# Altium footprint library HSD_connectors.PcbLib: 59 footprints (part 3 of 7)
Each footprint in its own frame and in the unit in brackets; x right, y up, seen from the top. Pads: shape width x height; smd on the part's side, far side on the other; paste and mask are expansions set on the pad; w line width, h text height; cw(c..) or ccw(c..) is an arc to the next point about the centre after c.
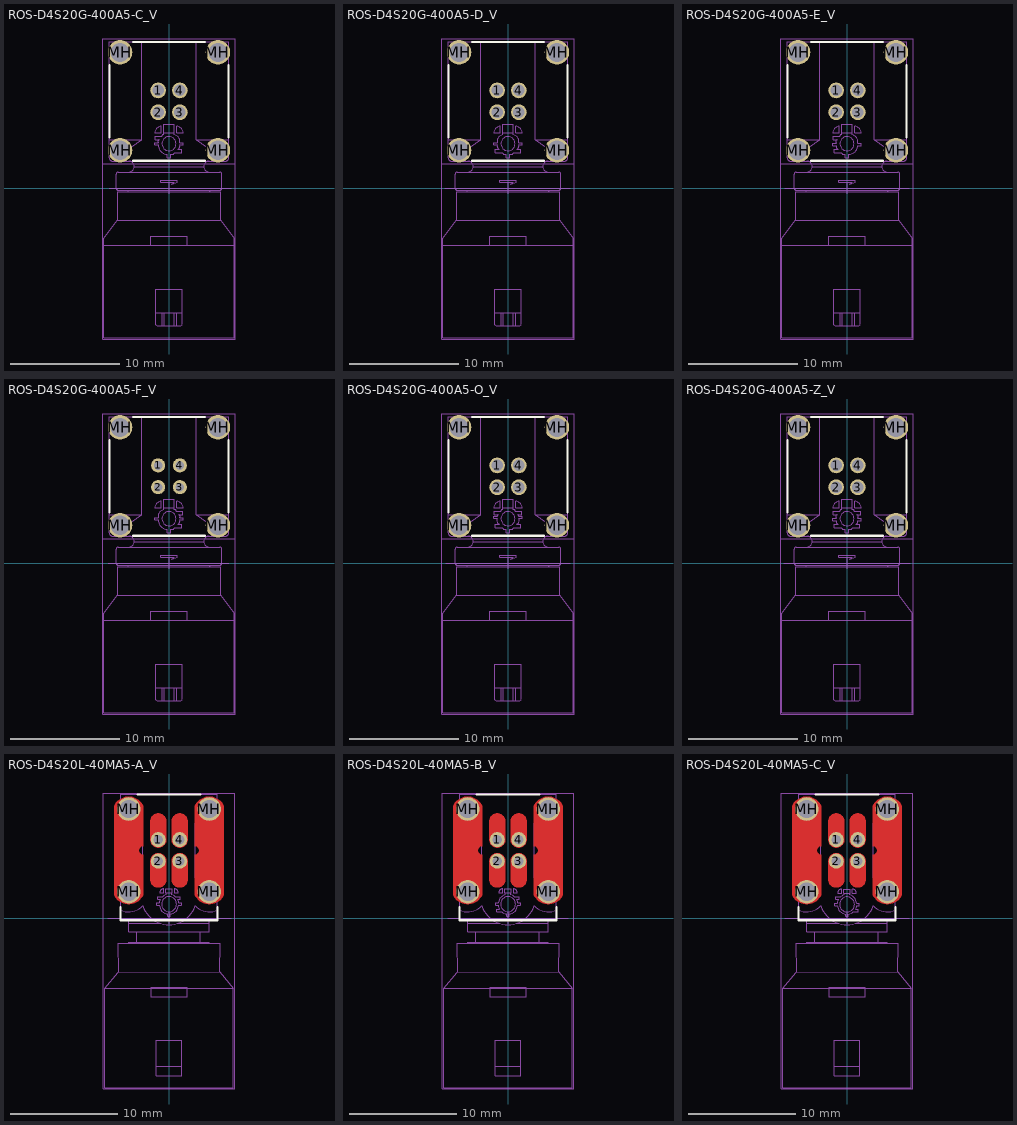
[diagram p2: the footprints below, top view; thin cyan lines are the x and y axes]

## ROS-D4S20G-400A5-C_V [mm] "HSD Right Angle Plug, 27.2x12x10.6mm, Rosenberger Recommended"
height 10.6
pads (8):
  round 1.45 hole 1.05: 1(-1,9) 2(-1,7) 3(1,7) 4(1,9)
  round 2.25 hole 1.75: MH(-4.5,3.5) MH(-4.5,12.5) MH(4.5,3.5) MH(4.5,12.5)
Top Overlay:
  lines w0.2: -5.461,4.684 -5.461,11.316 ; -3.316,2.539 3.316,2.539 ; -3.316,13.461 3.316,13.461 ; 5.461,4.684 5.461,11.316
Mechanical 3:
  lines w0.1: -5.5,0 5.7,0
  text "Board Edge" at -5.7,-0.7 h0.2
Mechanical 13:
  circle w0.1: c-0.002,4.102 r0.65
  lines w0.1: -5.958,-5.25 -1.7,-5.25 ; -4.025,2.5 -4.025,3.411 ; -3.853,-0.2 -3.734,-0.3 ; -3.7,2.5 cw(c-3.7,2) -3.7,1.5 ; -3.19,2.006 3.185,2.006 ; -2.507,4.444 -5.5,4.45 ; -2.498,13.45 -2.498,4.45 -4.025,3.411 ; -1.2,-11.45 1.185,-11.45 cw(c1.185,-11.472) 1.2,-11.456 ; -0.65,-11.45 -0.648,-12.647 ; -0.424,-12.653 -0.422,-11.456 ; 0.417,-11.456 0.419,-12.653 ; 0.5,5.084 0.5,4.919 cw(c0.387,4.315) 0.991,4.202 1.321,4.202 1.321,3.999 0.991,3.999 cw(c0.699,3.884) 0.813,3.592 1.168,3.592 1.168,3.288 0.533,3.288 cw(c0.267,3.402) 0.152,3.135 0.152,2.83 -0.152,2.83 -0.152,3.135 cw(c-0.14,3.986) -0.991,3.999 -1.321,3.999 -1.321,4.202 -0.991,4.202 cw(c-0.813,4.304) -0.914,4.481 -1.245,4.481 -1.245,4.786 -0.686,4.786 cw(c-0.528,4.758) -0.5,4.916 -0.5,5.1 ; 0.645,-11.45 0.648,-12.647 ; 1.2,-12.527 1.079,-12.647 -1.084,-12.647 -1.2,-12.531 -1.2,-9.3 1.2,-9.3 1.2,-12.5 ; 2.498,13.45 2.498,4.45 ; 3.7,2.5 ccw(c3.7,2) 3.7,1.5 ; 3.716,-0.3 3.809,-0.207 ; 4.025,2.5 4.025,3.411 ; 5.958,-5.25 1.7,-5.25 ; -5.5,3.411 -5.5,2.8 ccw(c-5.2,2.8) -5.2,2.5 5.2,2.5 ccw(c5.2,2.8) 5.5,2.8 5.5,3.411 ; -5.5,3.411 -4.025,3.411 ; -5.5,3.411 -5.5,4.45 ; -5.5,4.45 -5.5,13.45 5.5,13.45 5.5,4.45 ; -4.742,-2.95 4.742,-2.95 ; -4.742,-2.95 -4.75,-0.3 4.75,-0.3 4.742,-2.95 ; -4.742,-2.95 -6,-4.607 -6,-5.45 -6,-13.75 6,-13.75 6,-5.45 6,-4.607 4.742,-2.95 ; -3.7,1.5 3.7,1.5 ; -3.7,1.5 -4.65,1.5 ccw(c-4.65,1.3) -4.85,1.3 -4.85,0.017 ccw(c-4.65,0.017) -4.65,-0.183 -3.7,-0.183 3.7,-0.183 4.65,-0.183 ccw(c4.65,0.017) 4.85,0.017 4.85,1.3 ccw(c4.65,1.3) 4.65,1.5 3.7,1.5 ; -1.7,-5.25 1.7,-5.25 ; -1.7,-5.25 -1.7,-4.4 1.7,-4.4 1.7,-5.25 ; -0.5,5.1 0.5,5.1 0.5,5.9 -0.5,5.9 -0.5,5.1 ; 2.498,4.45 4.025,3.411 ; 2.498,4.45 5.5,4.45 ; 4.025,3.411 5.5,3.411 ; 5.5,3.411 5.5,4.45 ; -1.3,5.1 cw(c-0.7,5.1) -0.7,5.7 -0.7,5.1 -1.3,5.1 ; -0.75,0.562 -0.75,0.75 0.75,0.75 0.75,0.562 0.271,0.375 0.495,0.562 -0.75,0.562 ; 0.7,5.1 1.3,5.1 ccw(c0.7,5.1) 0.7,5.7 0.7,5.1
  text ".Designator" at -2.147,10.711 h2.69
Mechanical 15:
  lines w0.05: -6.1,2.275 6.096,2.275 ; -6.1,-13.85 6.1,-13.85 6.1,13.725 -6.1,13.725 -6.1,-13.85
  lines w0.1: -0.5,0 0.5,0 ; 0,-0.5 0,0.5
3D body "d4s20g-400A5-C.stp": height 13.63, standoff -2.87, extent -6,-13.75 6,13.45

## ROS-D4S20G-400A5-D_V [mm] "HSD Right Angle Plug, 27.2x12x10.6mm, Rosenberger Recommended"
height 10.6
pads (8):
  round 1.45 hole 1.05: 1(-1,9) 2(-1,7) 3(1,7) 4(1,9)
  round 2.25 hole 1.75: MH(-4.5,3.5) MH(-4.5,12.5) MH(4.5,3.5) MH(4.5,12.5)
Top Overlay:
  lines w0.2: -5.461,4.684 -5.461,11.316 ; -3.316,2.539 3.316,2.539 ; -3.316,13.461 3.316,13.461 ; 5.461,4.684 5.461,11.316
Mechanical 3:
  lines w0.1: -5.8,0 5.7,0
  text "Board Edge" at -5.7,-0.5 h0.2
Mechanical 13:
  circle w0.1: c-0.002,4.102 r0.65
  lines w0.1: -5.958,-5.25 -1.7,-5.25 ; -4.025,2.5 -4.025,3.411 ; -3.853,-0.2 -3.734,-0.3 ; -3.7,2.5 cw(c-3.7,2) -3.7,1.5 ; -3.19,2.006 3.185,2.006 ; -2.507,4.444 -5.5,4.45 ; -2.498,13.45 -2.498,4.45 -4.025,3.411 ; -1.2,-11.45 1.185,-11.45 cw(c1.185,-11.472) 1.2,-11.456 ; -0.65,-11.45 -0.648,-12.647 ; -0.424,-12.653 -0.422,-11.456 ; 0.417,-11.456 0.419,-12.653 ; 0.5,5.084 0.5,4.919 cw(c0.387,4.315) 0.991,4.202 1.321,4.202 1.321,3.999 0.991,3.999 cw(c0.699,3.884) 0.813,3.592 1.168,3.592 1.168,3.288 0.533,3.288 cw(c0.267,3.402) 0.152,3.135 0.152,2.83 -0.152,2.83 -0.152,3.135 cw(c-0.267,3.402) -0.533,3.288 -1.168,3.288 -1.168,3.592 -0.813,3.592 cw(c-0.699,3.884) -0.991,3.999 -1.321,3.999 -1.321,4.202 -0.991,4.202 cw(c-0.388,4.314) -0.5,4.916 -0.5,5.1 ; 0.645,-11.45 0.648,-12.647 ; 1.2,-12.527 1.079,-12.647 -1.084,-12.647 -1.2,-12.531 -1.2,-9.3 1.2,-9.3 1.2,-12.5 ; 2.498,13.45 2.498,4.45 ; 3.7,2.5 ccw(c3.7,2) 3.7,1.5 ; 3.716,-0.3 3.809,-0.207 ; 4.025,2.5 4.025,3.411 ; 5.958,-5.25 1.7,-5.25 ; -5.5,3.411 -5.5,2.8 ccw(c-5.2,2.8) -5.2,2.5 5.2,2.5 ccw(c5.2,2.8) 5.5,2.8 5.5,3.411 ; -5.5,3.411 -4.025,3.411 ; -5.5,3.411 -5.5,4.45 ; -5.5,4.45 -5.5,13.45 5.5,13.45 5.5,4.45 ; -4.742,-2.95 4.742,-2.95 ; -4.742,-2.95 -4.75,-0.3 4.75,-0.3 4.742,-2.95 ; -4.742,-2.95 -6,-4.607 -6,-5.45 -6,-13.75 6,-13.75 6,-5.45 6,-4.607 4.742,-2.95 ; -3.7,1.5 3.7,1.5 ; -3.7,1.5 -4.65,1.5 ccw(c-4.65,1.3) -4.85,1.3 -4.85,0.017 ccw(c-4.65,0.017) -4.65,-0.183 -3.7,-0.183 3.7,-0.183 4.65,-0.183 ccw(c4.65,0.017) 4.85,0.017 4.85,1.3 ccw(c4.65,1.3) 4.65,1.5 3.7,1.5 ; -1.7,-5.25 1.7,-5.25 ; -1.7,-5.25 -1.7,-4.4 1.7,-4.4 1.7,-5.25 ; -0.5,5.1 0.5,5.1 0.5,5.9 -0.5,5.9 -0.5,5.1 ; 2.498,4.45 4.025,3.411 ; 2.498,4.45 5.5,4.45 ; 4.025,3.411 5.5,3.411 ; 5.5,3.411 5.5,4.45 ; -1.3,5.1 cw(c-0.7,5.1) -0.7,5.7 -0.7,5.1 -1.3,5.1 ; -0.75,0.562 -0.75,0.75 0.75,0.75 0.75,0.562 0.271,0.375 0.495,0.562 -0.75,0.562 ; 0.7,5.1 0.7,5.7 cw(c0.7,5.1) 1.3,5.1 0.7,5.1
  text ".Designator" at -2.147,10.838 h2.69
Mechanical 15:
  lines w0.05: -6.1,2.275 6.096,2.275 ; -6.1,-13.85 6.1,-13.85 6.1,13.725 -6.1,13.725 -6.1,-13.85
  lines w0.1: -0.5,0 0.5,0 ; 0,-0.5 0,0.5
3D body "d4s20g-400A5-D.stp": height 13.63, standoff -2.87, extent -6,-13.75 6,13.45

## ROS-D4S20G-400A5-E_V [mm] "HSD Right Angle Plug, 27.2x12x10.6mm, Rosenberger Recommended"
height 10.6
pads (8):
  round 1.45 hole 1.05: 1(-1,9) 2(-1,7) 3(1,7) 4(1,9)
  round 2.25 hole 1.75: MH(-4.5,3.5) MH(-4.5,12.5) MH(4.5,3.5) MH(4.5,12.5)
Top Overlay:
  lines w0.2: -5.461,4.684 -5.461,11.316 ; -3.316,2.539 3.316,2.539 ; -3.316,13.461 3.316,13.461 ; 5.461,4.684 5.461,11.316
Mechanical 3:
  lines w0.1: -5.7,0 5.7,0
  text "Board Edge" at -5.7,-0.5 h0.2
Mechanical 13:
  circle w0.1: c-0.002,4.102 r0.65
  lines w0.1: -5.958,-5.25 -1.7,-5.25 ; -4.025,2.5 -4.025,3.411 ; -3.853,-0.2 -3.734,-0.3 ; -3.7,2.5 cw(c-3.7,2) -3.7,1.5 ; -3.19,2.006 3.185,2.006 ; -2.507,4.444 -5.5,4.45 ; -2.498,13.45 -2.498,4.45 -4.025,3.411 ; -1.2,-11.45 1.185,-11.45 cw(c1.185,-11.472) 1.2,-11.456 ; -0.65,-11.45 -0.648,-12.647 ; -0.424,-12.653 -0.422,-11.456 ; 0.417,-11.456 0.419,-12.653 ; 0.5,5.084 0.5,4.919 cw(c0.355,4.283) 0.991,4.138 1.321,4.138 1.321,3.935 0.991,3.935 cw(c0.171,3.954) 0.152,3.135 0.152,2.83 -0.152,2.83 -0.152,3.135 cw(c-0.267,3.402) -0.533,3.288 -1.168,3.288 -1.168,3.592 -0.813,3.592 cw(c-0.73,3.853) -0.991,3.935 -1.321,3.935 -1.321,4.138 -0.991,4.138 cw(c-0.781,4.272) -0.914,4.481 -1.245,4.481 -1.245,4.786 -0.686,4.786 cw(c-0.528,4.758) -0.5,4.916 -0.5,5.1 ; 0.645,-11.45 0.648,-12.647 ; 1.2,-12.527 1.079,-12.647 -1.084,-12.647 -1.2,-12.531 -1.2,-9.3 1.2,-9.3 1.2,-12.5 ; 2.498,13.45 2.498,4.45 ; 3.7,2.5 ccw(c3.7,2) 3.7,1.5 ; 3.716,-0.3 3.809,-0.207 ; 4.025,2.5 4.025,3.411 ; 5.958,-5.25 1.7,-5.25 ; -5.5,3.411 -5.5,2.8 ccw(c-5.2,2.8) -5.2,2.5 5.2,2.5 ccw(c5.2,2.8) 5.5,2.8 5.5,3.411 ; -5.5,3.411 -4.025,3.411 ; -5.5,3.411 -5.5,4.45 ; -5.5,4.45 -5.5,13.45 5.5,13.45 5.5,4.45 ; -4.742,-2.95 4.742,-2.95 ; -4.742,-2.95 -4.75,-0.3 4.75,-0.3 4.742,-2.95 ; -4.742,-2.95 -6,-4.607 -6,-5.45 -6,-13.75 6,-13.75 6,-5.45 6,-4.607 4.742,-2.95 ; -3.7,1.5 3.7,1.5 ; -3.7,1.5 -4.65,1.5 ccw(c-4.65,1.3) -4.85,1.3 -4.85,0.017 ccw(c-4.65,0.017) -4.65,-0.183 -3.7,-0.183 3.7,-0.183 4.65,-0.183 ccw(c4.65,0.017) 4.85,0.017 4.85,1.3 ccw(c4.65,1.3) 4.65,1.5 3.7,1.5 ; -1.7,-5.25 1.7,-5.25 ; -1.7,-5.25 -1.7,-4.4 1.7,-4.4 1.7,-5.25 ; -0.5,5.1 0.5,5.1 0.5,5.9 -0.5,5.9 -0.5,5.1 ; 2.498,4.45 4.025,3.411 ; 2.498,4.45 5.5,4.45 ; 4.025,3.411 5.5,3.411 ; 5.5,3.411 5.5,4.45 ; -1.3,5.1 cw(c-0.7,5.1) -0.7,5.7 -0.7,5.1 -1.3,5.1 ; -0.75,0.562 -0.75,0.75 0.75,0.75 0.75,0.562 0.271,0.375 0.495,0.562 -0.75,0.562 ; 0.7,5.1 0.7,5.7 cw(c0.7,5.1) 1.3,5.1 0.7,5.1
  text ".Designator" at -2.274,10.457 h2.69
Mechanical 15:
  lines w0.05: -6.1,2.275 6.096,2.275 ; -6.1,-13.85 -6.1,13.725 6.1,13.725 6.1,-13.85 -6.1,-13.85
  lines w0.1: -0.5,0 0.5,0 ; 0,-0.5 0,0.5
3D body "d4s20g-400A5-E.stp": height 13.63, standoff -2.87, extent -6,-13.75 6,13.45

## ROS-D4S20G-400A5-F_V [mm] "HSD Right Angle Plug, 27.2x12x10.6mm, Rosenberger Recommended"
height 10.6
pads (8):
  round 1.3 hole 0.8: 1(-1,9) 2(-1,7) 3(1,7) 4(1,9)
  round 2.25 hole 1.75: MH(-4.5,3.5) MH(-4.5,12.5) MH(4.5,3.5) MH(4.5,12.5)
Top Overlay:
  lines w0.2: -5.461,4.684 -5.461,11.316 ; -3.316,2.539 3.316,2.539 ; -3.316,13.461 3.316,13.461 ; 5.461,4.684 5.461,11.316
Mechanical 3:
  lines w0.1: -5.6,0 5.5,0
  text "Board Edge" at -5.8,-0.5 h0.2
Mechanical 13:
  circle w0.1: c0.002,4.102 r0.65
  lines w0.1: -5.958,-5.25 -1.7,-5.25 ; -4.025,2.5 -4.025,3.411 ; -3.853,-0.2 -3.734,-0.3 ; -3.7,2.5 cw(c-3.7,2) -3.7,1.5 ; -3.19,2.006 3.185,2.006 ; -2.507,4.444 -5.5,4.45 ; -2.498,13.45 -2.498,4.45 -4.025,3.411 ; -1.2,-11.45 1.185,-11.45 cw(c1.185,-11.472) 1.2,-11.456 ; -0.65,-11.45 -0.648,-12.647 ; -0.424,-12.653 -0.422,-11.456 ; 0.417,-11.456 0.419,-12.653 ; 0.5,5.084 0.5,4.919 cw(c0.527,4.76) 0.686,4.786 1.245,4.786 1.245,4.481 0.914,4.481 cw(c0.813,4.304) 0.991,4.202 1.321,4.202 1.321,3.999 0.991,3.999 cw(c0.699,3.884) 0.813,3.592 1.168,3.592 1.168,3.288 0.533,3.288 cw(c0.267,3.402) 0.152,3.135 0.152,2.83 -0.152,2.83 -0.152,3.135 cw(c-0.14,3.986) -0.991,3.999 -1.321,3.999 -1.321,4.202 -0.991,4.202 cw(c-0.388,4.314) -0.5,4.916 -0.5,5.1 ; 0.645,-11.45 0.648,-12.647 ; 1.2,-12.527 1.079,-12.647 -1.084,-12.647 -1.2,-12.531 -1.2,-9.3 1.2,-9.3 1.2,-12.5 ; 2.498,13.45 2.498,4.45 ; 3.7,2.5 ccw(c3.7,2) 3.7,1.5 ; 3.716,-0.3 3.809,-0.207 ; 4.025,2.5 4.025,3.411 ; 5.958,-5.25 1.7,-5.25 ; -5.5,3.411 -5.5,4.45 ; -5.5,3.411 -4.025,3.411 ; -5.5,3.411 -5.5,2.8 ccw(c-5.2,2.8) -5.2,2.5 5.2,2.5 ccw(c5.2,2.8) 5.5,2.8 5.5,3.411 ; -5.5,4.45 -5.5,13.45 5.5,13.45 5.5,4.45 ; -4.742,-2.95 -6,-4.607 -6,-5.45 -6,-13.75 6,-13.75 6,-5.45 6,-4.607 4.742,-2.95 ; -4.742,-2.95 -4.75,-0.3 4.75,-0.3 4.742,-2.95 ; -4.742,-2.95 4.742,-2.95 ; -3.7,1.5 -4.65,1.5 ccw(c-4.65,1.3) -4.85,1.3 -4.85,0.017 ccw(c-4.65,0.017) -4.65,-0.183 -3.7,-0.183 3.7,-0.183 4.65,-0.183 ccw(c4.65,0.017) 4.85,0.017 4.85,1.3 ccw(c4.65,1.3) 4.65,1.5 3.7,1.5 ; -3.7,1.5 3.7,1.5 ; -1.7,-5.25 -1.7,-4.4 1.7,-4.4 1.7,-5.25 ; -1.7,-5.25 1.7,-5.25 ; -0.5,5.1 -0.5,5.9 0.5,5.9 0.5,5.1 -0.5,5.1 ; 2.498,4.45 5.5,4.45 ; 2.498,4.45 4.025,3.411 ; 4.025,3.411 5.5,3.411 ; 5.5,3.411 5.5,4.45 ; -1.3,5.1 cw(c-0.7,5.1) -0.7,5.7 -0.7,5.1 -1.3,5.1 ; -0.75,0.562 0.495,0.562 0.271,0.375 0.75,0.562 0.75,0.75 -0.75,0.75 -0.75,0.562 ; 0.7,5.1 1.3,5.1 ccw(c0.7,5.1) 0.7,5.7 0.7,5.1
  text ".Designator" at -2.401,10.457 h2.69
Mechanical 15:
  lines w0.05: -6.1,2.275 6.096,2.275 ; -6.1,-13.85 -6.1,13.725 6.1,13.725 6.1,-13.85 -6.1,-13.85
  lines w0.1: -0.5,0 0.5,0 ; 0,-0.5 0,0.5
3D body "d4s20g-400A5-F.stp": height 13.63, standoff -2.87, extent -6,-13.75 6,13.45

## ROS-D4S20G-400A5-O_V [mm] "HSD Right Angle Plug, 27.2x12x10.6mm, Rosenberger Recommended"
height 10.6
pads (8):
  round 1.45 hole 1.05: 1(-1,9) 2(-1,7) 3(1,7) 4(1,9)
  round 2.25 hole 1.75: MH(-4.5,3.5) MH(-4.5,12.5) MH(4.5,3.5) MH(4.5,12.5)
Top Overlay:
  lines w0.2: -5.461,4.684 -5.461,11.316 ; -3.316,2.539 3.316,2.539 ; -3.316,13.461 3.316,13.461 ; 5.461,4.684 5.461,11.316
Mechanical 3:
  lines w0.1: -5.7,0 5.7,0
  text "Board Edge" at -5.6,-0.5 h0.2
Mechanical 13:
  circle w0.1: c-0.002,4.102 r0.65
  lines w0.1: -5.958,-5.25 -1.7,-5.25 ; -4.025,2.5 -4.025,3.411 ; -3.853,-0.2 -3.734,-0.3 ; -3.7,2.5 cw(c-3.7,2) -3.7,1.5 ; -3.19,2.006 3.185,2.006 ; -2.507,4.444 -5.5,4.45 ; -2.498,13.45 -2.498,4.45 -4.025,3.411 ; -1.2,-11.45 1.185,-11.45 cw(c1.185,-11.472) 1.2,-11.456 ; -0.65,-11.45 -0.648,-12.647 ; -0.424,-12.653 -0.422,-11.456 ; 0.417,-11.456 0.419,-12.653 ; 0.5,5.084 0.5,4.919 cw(c0.527,4.76) 0.686,4.786 1.245,4.786 1.245,4.481 0.914,4.481 cw(c0.876,4.367) 0.991,4.329 1.321,4.329 1.321,4.126 0.991,4.126 cw(c0.635,3.948) 0.813,3.592 1.168,3.592 1.168,3.288 0.533,3.288 cw(c0.267,3.402) 0.152,3.135 0.152,2.83 -0.152,2.83 -0.152,3.135 cw(c-0.267,3.402) -0.533,3.288 -1.168,3.288 -1.168,3.592 -0.813,3.592 cw(c-0.635,3.948) -0.991,4.126 -1.321,4.126 -1.321,4.329 -0.991,4.329 cw(c-0.876,4.367) -0.914,4.481 -1.245,4.481 -1.245,4.786 -0.686,4.786 cw(c-0.528,4.758) -0.5,4.916 -0.5,5.1 ; 0.645,-11.45 0.648,-12.647 ; 1.2,-12.527 1.079,-12.647 -1.084,-12.647 -1.2,-12.531 -1.2,-9.3 1.2,-9.3 1.2,-12.5 ; 2.498,13.45 2.498,4.45 ; 3.7,2.5 ccw(c3.7,2) 3.7,1.5 ; 3.716,-0.3 3.809,-0.207 ; 4.025,2.5 4.025,3.411 ; 5.958,-5.25 1.7,-5.25 ; -5.5,3.411 -5.5,4.45 ; -5.5,3.411 -4.025,3.411 ; -5.5,3.411 -5.5,2.8 ccw(c-5.2,2.8) -5.2,2.5 5.2,2.5 ccw(c5.2,2.8) 5.5,2.8 5.5,3.411 ; -5.5,4.45 -5.5,13.45 5.5,13.45 5.5,4.45 ; -4.742,-2.95 -6,-4.607 -6,-5.45 -6,-13.75 6,-13.75 6,-5.45 6,-4.607 4.742,-2.95 ; -4.742,-2.95 -4.75,-0.3 4.75,-0.3 4.742,-2.95 ; -4.742,-2.95 4.742,-2.95 ; -3.7,1.5 -4.65,1.5 ccw(c-4.65,1.3) -4.85,1.3 -4.85,0.017 ccw(c-4.65,0.017) -4.65,-0.183 -3.7,-0.183 3.7,-0.183 4.65,-0.183 ccw(c4.65,0.017) 4.85,0.017 4.85,1.3 ccw(c4.65,1.3) 4.65,1.5 3.7,1.5 ; -3.7,1.5 3.7,1.5 ; -1.7,-5.25 -1.7,-4.4 1.7,-4.4 1.7,-5.25 ; -1.7,-5.25 1.7,-5.25 ; -0.5,5.1 -0.5,5.9 0.5,5.9 0.5,5.1 -0.5,5.1 ; 2.498,4.45 5.5,4.45 ; 2.498,4.45 4.025,3.411 ; 4.025,3.411 5.5,3.411 ; 5.5,3.411 5.5,4.45 ; -1.3,5.1 cw(c-0.7,5.1) -0.7,5.7 -0.7,5.1 -1.3,5.1 ; -0.75,0.562 0.495,0.562 0.271,0.375 0.75,0.562 0.75,0.75 -0.75,0.75 -0.75,0.562 ; 0.7,5.1 1.3,5.1 ccw(c0.7,5.1) 0.7,5.7 0.7,5.1
  text ".Designator" at -2.147,10.457 h2.69
Mechanical 15:
  lines w0.05: -6.1,2.275 6.096,2.275 ; -6.1,-13.85 6.1,-13.85 6.1,13.725 -6.1,13.725 -6.1,-13.85
  lines w0.1: -0.5,0 0.5,0 ; 0,-0.5 0,0.5
3D body "d4s20g-400A5-O.stp": height 13.63, standoff -2.87, extent -6,-13.75 6,13.45

## ROS-D4S20G-400A5-Z_V [mm] "HSD Right Angle Plug, 27.2x12x13.5mm, Rosenberger Recommended"
height 10.6
pads (8):
  round 1.45 hole 1.05: 1(-1,9) 2(-1,7) 3(1,7) 4(1,9)
  round 2.25 hole 1.75: MH(-4.5,3.5) MH(-4.5,12.5) MH(4.5,3.5) MH(4.5,12.5)
Top Overlay:
  lines w0.2: -5.461,4.684 -5.461,11.316 ; -3.316,2.539 3.316,2.539 ; -3.316,13.461 3.316,13.461 ; 5.461,4.684 5.461,11.316
Mechanical 3:
  lines w0.1: -5.8,0 5.8,0
  text "Board Edge" at -5.9,-0.4 h0.2
Mechanical 13:
  circle w0.1: c-0.002,4.102 r0.65
  lines w0.1: -5.958,-5.25 -1.7,-5.25 ; -4.025,2.5 -4.025,3.411 ; -3.853,-0.2 -3.734,-0.3 ; -3.7,2.5 cw(c-3.7,2) -3.7,1.5 ; -3.19,2.006 3.185,2.006 ; -2.507,4.444 -5.5,4.45 ; -2.498,13.45 -2.498,4.45 -4.025,3.411 ; -1.2,-11.45 1.185,-11.45 cw(c1.185,-11.472) 1.2,-11.456 ; -0.65,-11.45 -0.648,-12.647 ; -0.424,-12.653 -0.422,-11.456 ; 0.417,-11.456 0.419,-12.653 ; 0.5,5.084 0.5,4.919 cw(c0.527,4.76) 0.686,4.786 1.245,4.786 1.245,4.481 0.914,4.481 cw(c0.781,4.272) 0.991,4.138 1.321,4.138 1.321,3.935 0.991,3.935 cw(c0.73,3.853) 0.813,3.592 1.168,3.592 1.168,3.288 0.533,3.288 cw(c0.267,3.402) 0.152,3.135 0.152,2.83 -0.152,2.83 -0.152,3.135 cw(c-0.267,3.402) -0.533,3.288 -1.168,3.288 -1.168,3.592 -0.813,3.592 cw(c-0.73,3.853) -0.991,3.935 -1.321,3.935 -1.321,4.138 -0.991,4.138 cw(c-0.781,4.272) -0.914,4.481 -1.245,4.481 -1.245,4.786 -0.686,4.786 cw(c-0.528,4.758) -0.5,4.916 -0.5,5.1 ; 0.645,-11.45 0.648,-12.647 ; 1.2,-12.527 1.079,-12.647 -1.084,-12.647 -1.2,-12.531 -1.2,-9.3 1.2,-9.3 1.2,-12.5 ; 2.498,13.45 2.498,4.45 ; 3.7,2.5 ccw(c3.7,2) 3.7,1.5 ; 3.716,-0.3 3.809,-0.207 ; 4.025,2.5 4.025,3.411 ; 5.958,-5.25 1.7,-5.25 ; -5.5,3.411 -5.5,2.8 ccw(c-5.2,2.8) -5.2,2.5 5.2,2.5 ccw(c5.2,2.8) 5.5,2.8 5.5,3.411 ; -5.5,3.411 -4.025,3.411 ; -5.5,3.411 -5.5,4.45 ; -5.5,4.45 -5.5,13.45 5.5,13.45 5.5,4.45 ; -4.742,-2.95 4.742,-2.95 ; -4.742,-2.95 -4.75,-0.3 4.75,-0.3 4.742,-2.95 ; -4.742,-2.95 -6,-4.607 -6,-5.45 -6,-13.75 6,-13.75 6,-5.45 6,-4.607 4.742,-2.95 ; -3.7,1.5 3.7,1.5 ; -3.7,1.5 -4.65,1.5 ccw(c-4.65,1.3) -4.85,1.3 -4.85,0.017 ccw(c-4.65,0.017) -4.65,-0.183 -3.7,-0.183 3.7,-0.183 4.65,-0.183 ccw(c4.65,0.017) 4.85,0.017 4.85,1.3 ccw(c4.65,1.3) 4.65,1.5 3.7,1.5 ; -1.7,-5.25 1.7,-5.25 ; -1.7,-5.25 -1.7,-4.4 1.7,-4.4 1.7,-5.25 ; -0.5,5.1 0.5,5.1 0.5,5.9 -0.5,5.9 -0.5,5.1 ; 2.498,4.45 4.025,3.411 ; 2.498,4.45 5.5,4.45 ; 4.025,3.411 5.5,3.411 ; 5.5,3.411 5.5,4.45 ; -1.3,5.1 cw(c-0.7,5.1) -0.7,5.7 -0.7,5.1 -1.3,5.1 ; -0.75,0.562 -0.75,0.75 0.75,0.75 0.75,0.562 0.271,0.375 0.495,0.562 -0.75,0.562 ; 0.7,5.1 0.7,5.7 cw(c0.7,5.1) 1.3,5.1 0.7,5.1
  text ".Designator" at -2.147,10.33 h2.69
Mechanical 15:
  lines w0.05: -6.1,2.275 6.096,2.275 ; -6.1,-13.85 6.1,-13.85 6.1,13.725 -6.1,13.725 -6.1,-13.85
  lines w0.1: -0.5,0 0.5,0 ; 0,-0.5 0,0.5
3D body "d4s20g-400A5-Z.stp": height 13.63, standoff -2.87, extent -6,-13.75 6,13.45

## ROS-D4S20L-40MA5-A_V [mm] "HSD Right Angle Plug, Edge Mount Pin in Paste, 27.3x12x6.95mm, Rosenberger Recommended"
height 6.95
pads (8):
  round 1.4 hole 0.9: 1(-1,7.307) 2(-1,5.307) 3(1,5.307) 4(1,7.307)
  round 2.2 hole 1.7: MH(-3.75,2.457) MH(-3.75,10.157) MH(3.75,2.457) MH(3.75,10.157)
Top Layer:
  region: 1.75,9.007 1.75,9.081 1.721,9.226 1.665,9.362 1.583,9.485 1.478,9.59 1.355,9.672 1.219,9.728 1.074,9.757 1,9.757 1,7.757 1.088,7.748 1.25,7.681 1.374,7.557 1.441,7.395 1.441,7.219 1.374,7.057 1.25,6.933 1.088,6.866 1,6.857 1,6.557 1.074,6.557 1.219,6.586 1.355,6.642 1.478,6.724 1.583,6.829 1.665,6.952 1.721,7.088 1.75,7.233 1.75,7.307
  region: 0.25,9.007 0.25,9.081 0.279,9.226 0.335,9.362 0.417,9.485 0.522,9.59 0.645,9.672 0.781,9.728 0.926,9.757 1,9.757 1,7.757 0.912,7.748 0.75,7.681 0.626,7.557 0.559,7.395 0.559,7.219 0.626,7.057 0.75,6.933 0.912,6.866 1,6.857 1,6.557 0.926,6.557 0.781,6.586 0.645,6.642 0.522,6.724 0.417,6.829 0.335,6.952 0.279,7.088 0.25,7.233 0.25,7.307
  region: 0.25,3.607 0.25,3.533 0.279,3.388 0.335,3.252 0.417,3.129 0.522,3.024 0.645,2.942 0.781,2.886 0.926,2.857 1,2.857 1,4.857 0.912,4.866 0.75,4.933 0.626,5.057 0.559,5.219 0.559,5.395 0.626,5.557 0.75,5.681 0.912,5.748 1,5.757 1,6.057 0.926,6.057 0.781,6.028 0.645,5.972 0.522,5.89 0.417,5.785 0.335,5.662 0.279,5.526 0.25,5.381 0.25,5.307
  region: 1.75,3.607 1.75,3.533 1.721,3.388 1.665,3.252 1.583,3.129 1.478,3.024 1.355,2.942 1.219,2.886 1.074,2.857 1,2.857 1,4.857 1.088,4.866 1.25,4.933 1.374,5.057 1.441,5.219 1.441,5.395 1.374,5.557 1.25,5.681 1.088,5.748 1,5.757 1,6.057 1.074,6.057 1.219,6.028 1.355,5.972 1.478,5.89 1.583,5.785 1.665,5.662 1.721,5.526 1.75,5.381 1.75,5.307
  region: -0.25,3.607 -0.25,3.533 -0.279,3.388 -0.335,3.252 -0.417,3.129 -0.522,3.024 -0.645,2.942 -0.781,2.886 -0.926,2.857 -1,2.857 -1,4.857 -0.912,4.866 -0.75,4.933 -0.626,5.057 -0.559,5.219 -0.559,5.395 -0.626,5.557 -0.75,5.681 -0.912,5.748 -1,5.757 -1,6.057 -0.926,6.057 -0.781,6.028 -0.645,5.972 -0.522,5.89 -0.417,5.785 -0.335,5.662 -0.279,5.526 -0.25,5.381 -0.25,5.307
  region: -1.75,3.607 -1.75,3.533 -1.721,3.388 -1.665,3.252 -1.583,3.129 -1.478,3.024 -1.355,2.942 -1.219,2.886 -1.074,2.857 -1,2.857 -1,4.857 -1.088,4.866 -1.25,4.933 -1.374,5.057 -1.441,5.219 -1.441,5.395 -1.374,5.557 -1.25,5.681 -1.088,5.748 -1,5.757 -1,6.057 -1.074,6.057 -1.219,6.028 -1.355,5.972 -1.478,5.89 -1.583,5.785 -1.665,5.662 -1.721,5.526 -1.75,5.381 -1.75,5.307
  region: -0.25,9.007 -0.25,9.081 -0.279,9.226 -0.335,9.362 -0.417,9.485 -0.522,9.59 -0.645,9.672 -0.781,9.728 -0.926,9.757 -1,9.757 -1,7.757 -0.912,7.748 -0.75,7.681 -0.626,7.557 -0.559,7.395 -0.559,7.219 -0.626,7.057 -0.75,6.933 -0.912,6.866 -1,6.857 -1,6.557 -0.926,6.557 -0.781,6.586 -0.645,6.642 -0.522,6.724 -0.417,6.829 -0.335,6.952 -0.279,7.088 -0.25,7.233 -0.25,7.307
  region: -1.75,9.007 -1.75,9.081 -1.721,9.226 -1.665,9.362 -1.583,9.485 -1.478,9.59 -1.355,9.672 -1.219,9.728 -1.074,9.757 -1,9.757 -1,7.757 -1.088,7.748 -1.25,7.681 -1.374,7.557 -1.441,7.395 -1.441,7.219 -1.374,7.057 -1.25,6.933 -1.088,6.866 -1,6.857 -1,6.557 -1.074,6.557 -1.219,6.586 -1.355,6.642 -1.478,6.724 -1.583,6.829 -1.665,6.952 -1.721,7.088 -1.75,7.233 -1.75,7.307
  region: 5.1,6.307 3.75,6.307 3.75,3.307 3.861,3.3 4.075,3.242 4.267,3.131 4.424,2.974 4.535,2.782 4.593,2.568 4.593,2.346 4.535,2.132 4.424,1.94 4.267,1.783 4.075,1.672 3.861,1.614 3.75,1.607 3.75,1.307 3.855,1.307 4.064,1.336 4.267,1.395 4.459,1.481 4.637,1.593 4.798,1.729 4.939,1.886 5.056,2.061 5.102,2.156 5.1,2.156
  region: 3.75,1.307 3.645,1.307 3.436,1.336 3.233,1.395 3.041,1.481 2.863,1.593 2.702,1.729 2.561,1.886 2.444,2.061 2.398,2.156 2.4,2.156 2.4,5.907 2.478,5.915 2.622,5.974 2.733,6.085 2.792,6.229 2.8,6.307 3.75,6.307 3.75,3.307 3.639,3.3 3.425,3.242 3.233,3.131 3.076,2.974 2.965,2.782 2.907,2.568 2.907,2.346 2.965,2.132 3.076,1.94 3.233,1.783 3.425,1.672 3.639,1.614 3.75,1.607